# Altium footprint library PcbLib1.PcbLib: 150 footprints (part 9 of 10)
Each footprint in its own frame and in the unit in brackets; x right, y up, seen from the top. Pads: shape width x height; smd on the part's side, far side on the other; paste and mask are expansions set on the pad; w line width, h text height; cw(c..) or ccw(c..) is an arc to the next point about the centre after c.
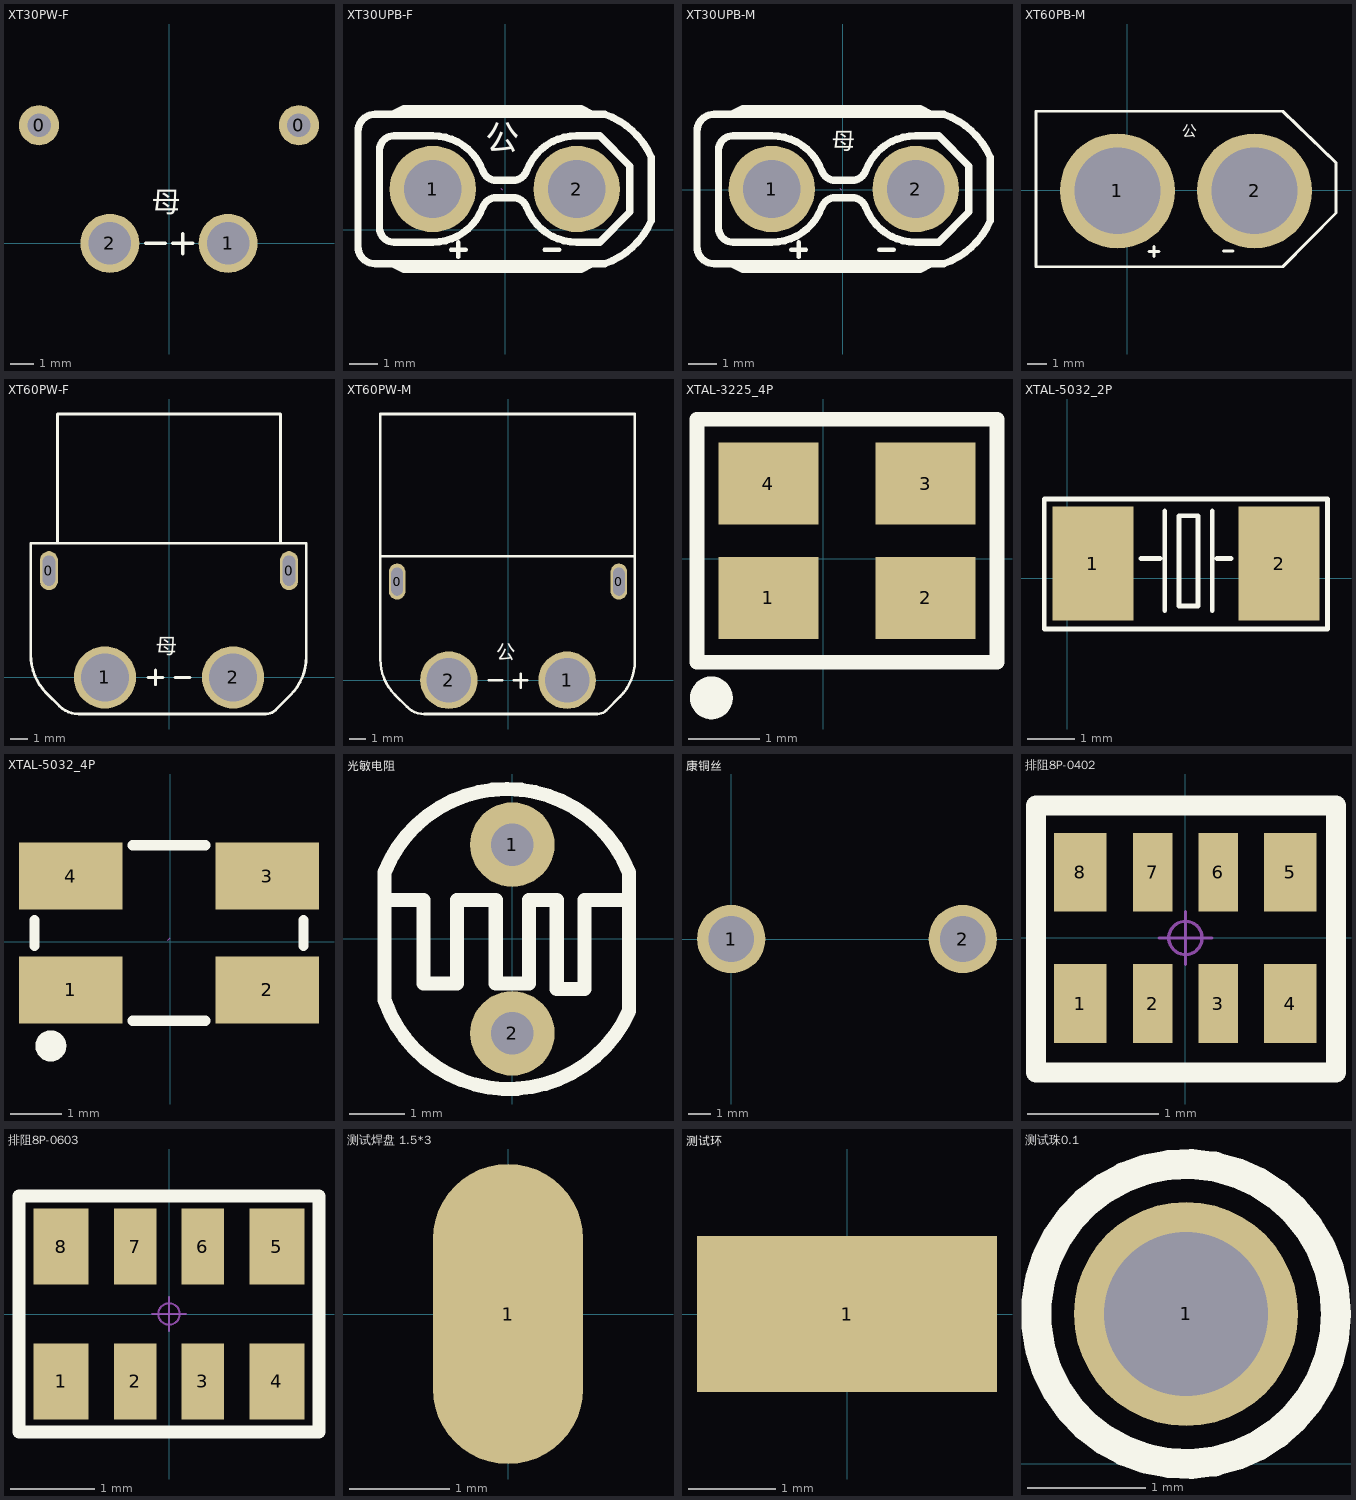
[diagram p8: the footprints below, top view; thin cyan lines are the x and y axes]

## XT30PW-F [mm]
pads (4):
  round 1.7 hole 1 unplated: 0(-5.5,5) 0(5.5,5)
  round 2.5 hole 1.8: 1(2.5,0) 2(-2.5,0)
Top Overlay:
  lines w0.152: -0.991,0 -0.152,0 ; 0.165,0 1.003,0 ; 0.584,-0.445 0.584,0.394
  text "母" at -0.737,1.016 h1.52
3D body "User Library-XT30PW-F.STEP": height 5, standoff -2, extent -6.701,-0.959 6.599,13.941

## XT30UPB-F [mm]
pads (2):
  round 3 hole 2: 1(-2.511,1.422) 2(2.489,1.422)
Top Overlay:
  lines w0.152: -1.88,-0.686 -1.372,-0.686 ; -1.626,-0.94 -1.626,-0.432 ; 1.372,-0.686 1.88,-0.686
  lines w0.254: -3.911,-1.177 -3.511,-1.377 2.639,-1.377 3.039,-1.177 ; -3.911,4.023 -3.511,4.223 2.639,4.223 3.039,4.023 ; -5.111,-0.577 ccw(c-4.511,-0.577) -4.511,-1.177 3.464,-1.177 ccw(c2.568,1.423) 5.089,0.323 5.089,2.523 ccw(c2.568,1.423) 3.464,4.023 -4.511,4.023 ccw(c-4.511,3.423) -5.111,3.423 -5.111,-0.577 ; -4.361,0.073 ccw(c-3.861,0.073) -3.861,-0.427 -2.511,-0.427 ccw(c-2.511,1.423) -0.772,0.793 cw(c-0.302,0.623) -0.302,1.123 0.279,1.123 cw(c0.279,0.623) 0.749,0.793 ccw(c2.489,1.423) 2.489,-0.427 3.289,-0.427 4.339,0.623 4.339,2.223 3.289,3.273 2.489,3.273 ccw(c2.489,1.423) 0.749,2.052 cw(c0.279,2.223) 0.279,1.723 -0.302,1.723 cw(c-0.302,2.223) -0.772,2.052 ccw(c-2.511,1.423) -2.511,3.273 -3.861,3.273 ccw(c-3.861,2.773) -4.361,2.773 -4.361,0.073
  text "公" at -0.711,2.515 h1.52
Mechanical 15:
  lines w0.003: -0.15,1.448 -0.099,1.397
3D body "User Library-XT30UPB-F-1.STEP": height 9.6, standoff -1.8, extent -5.049,-1.143 5.151,4.057

## XT30UPB-M [mm]
pads (2):
  round 3 hole 2: 1(-2.46,0.025) 2(2.54,0.025)
Top Overlay:
  lines w0.152: -1.778,-2.083 -1.27,-2.083 ; -1.524,-2.337 -1.524,-1.829 ; 1.27,-2.083 1.778,-2.083
  lines w0.254: -3.86,-2.574 -3.46,-2.774 2.69,-2.774 3.09,-2.574 ; -3.86,2.626 -3.46,2.826 2.69,2.826 3.09,2.626 ; -5.06,-1.974 ccw(c-4.46,-1.974) -4.46,-2.574 3.515,-2.574 ccw(c2.619,0.026) 5.14,-1.074 5.14,1.126 ccw(c2.619,0.026) 3.515,2.626 -4.46,2.626 ccw(c-4.46,2.026) -5.06,2.026 -5.06,-1.974 ; -4.31,-1.324 ccw(c-3.81,-1.324) -3.81,-1.824 -2.46,-1.824 ccw(c-2.46,0.026) -0.721,-0.604 cw(c-0.251,-0.774) -0.251,-0.274 0.33,-0.274 cw(c0.33,-0.774) 0.8,-0.604 ccw(c2.54,0.026) 2.54,-1.824 3.34,-1.824 4.39,-0.774 4.39,0.826 3.34,1.876 2.54,1.876 ccw(c2.54,0.026) 0.8,0.655 cw(c0.33,0.826) 0.33,0.326 -0.251,0.326 cw(c-0.251,0.826) -0.721,0.655 ccw(c-2.46,0.026) -2.46,1.876 -3.81,1.876 ccw(c-3.81,1.376) -4.31,1.376 -4.31,-1.324
  text "母" at -0.381,1.194 h1.02
Mechanical 15:
  lines w0.003: -0.099,0.051 -0.048,0
3D body "User Library-XT30.STEP": height 12.6, standoff -2.9, extent -5.149,-2.684 5.251,2.616

## XT60PB-M [mm]
pads (2):
  round 6 hole 4.5: 1(-0.508,-0.025) 2(6.629,-0.025)
Top Overlay:
  lines w0.152: 1.143,-3.175 1.651,-3.175 ; 1.397,-3.429 1.397,-2.921 ; 5.004,-3.15 5.512,-3.15 ; -4.75,-3.974 -4.75,4.126 8.103,4.126 10.871,1.448 10.871,-1.168 8.103,-3.974 -4.75,-3.974
  text "公" at 2.845,2.616 h1.02
3D body "XT60UPB Fem Vert.STEP": height 13.54, standoff -2.06, extent -4.653,-4.001 10.69,3.9

## XT60PW-F [mm]
pads (4):
  oval 1x2.2 hole 0.7 slot 1.7 at 90 deg: 0(-6.75,6) 0(6.75,6)
  round 3.5 hole 2.7: 1(-3.6,0) 2(3.6,0)
Top Overlay:
  lines w0.152: -6.274,7.544 -6.274,14.808 6.274,14.808 6.274,7.645 ; -1.181,0 -0.343,0 ; -0.762,-0.419 -0.762,0.419 ; 0.343,0 1.181,0 ; -7.772,1.27 ccw(c-4.706,1.27) -6.874,-0.898 -6.158,-1.615 ccw(c-5.089,-0.545) -5.089,-2.057 -4.902,-2.057 5.258,-2.057 5.443,-2.057 ccw(c5.443,-1.277) 5.994,-1.829 6.824,-1 ccw(c4.656,1.168) 7.722,1.168 7.722,1.905 7.722,7.544 -7.772,7.544 -7.772,2.007 -7.772,1.27
  text "母" at -0.737,1.016 h1.52
3D body "XT60PW_F.STEP": height 8.93, standoff -1.57, extent -7.95,-1.944 7.95,15.356

## XT60PW-M [mm]
pads (4):
  oval 1x2.2 hole 0.7 slot 1.7 at 90 deg: 0(-6.75,6) 0(6.75,6)
  round 3.5 hole 2.7: 1(3.6,0) 2(-3.6,0)
Top Overlay:
  lines w0.152: -1.181,0 -0.343,0 ; 0.343,0 1.181,0 ; 0.762,-0.445 0.762,0.394 ; 7.722,7.468 7.722,16.205 -7.772,16.205 -7.772,7.544 ; -7.772,7.544 -7.772,2.007 -7.772,1.27 ccw(c-4.706,1.27) -6.874,-0.898 -6.158,-1.615 ccw(c-5.089,-0.545) -5.089,-2.057 -4.902,-2.057 5.258,-2.057 5.443,-2.057 ccw(c5.443,-1.277) 5.994,-1.829 6.824,-1 ccw(c4.656,1.168) 7.722,1.168 7.722,1.905 7.722,7.544 -7.772,7.544
  text "公" at -0.737,1.016 h1.52
3D body "XT60PW 3D DRAWING.STEP": height 9.18, standoff -1.32, extent -7.924,-1.936 7.976,16.364

## XTAL-3225_4P [mm]
pads (5):
  round 0 smd: 1(-0.77,-0.55)
  rect 1.4x1.15 smd: 1(-0.77,-0.55) 2(1.43,-0.55) 3(1.43,1.051) 4(-0.77,1.051)
Top Overlay:
  lines w0.203: -1.77,-1.45 2.43,-1.45 2.43,1.95 -1.77,1.95 -1.77,-1.45
  lines w0.3: -1.57,-1.799 ccw(c-1.569,-1.949) -1.567,-1.799
3D body "User Library-SG310.STEP": height 1.05, standoff 0, extent -1.244,-1.021 1.956,1.479

## XTAL-5032_2P [mm]
pads (2):
  rect 1.7x2.4 smd: 1(0.545,0.312) 2(4.466,0.311)
Top Overlay:
  lines w0.1: 1.559,0.421 1.959,0.421 ; 2.059,-0.679 2.059,1.421 ; 3.059,-0.679 3.059,1.421 ; 3.159,0.421 3.459,0.421 ; 2.359,-0.579 2.759,-0.579 2.759,1.321 2.359,1.321 2.359,-0.579
  lines w0.102: -0.483,-1.067 -0.483,1.676 5.486,1.676 5.486,-1.067 -0.483,-1.067

## XTAL-5032_4P [mm]
pads (4):
  rect 2x1.3 smd: 1(-1.921,-0.927) 2(1.879,-0.927) 3(1.879,1.273) 4(-1.921,1.273)
Top Overlay:
  lines w0.2: -2.622,-0.076 -2.622,0.422 ; -0.722,-1.526 0.68,-1.526 ; -0.722,1.872 0.68,1.872 ; 2.58,-0.076 2.58,0.422
  lines w0.3: -2.307,-1.859 ccw(c-2.306,-2.009) -2.304,-1.859
Mechanical 15:
  lines w0.003: -0.046,0.029 0.004,0.08
3D body "User Library-CRYSTALSMD5X32.STEP": height 1, standoff 0, extent -2.525,-1.447 2.475,1.753

## 光敏电阻 [mil]
pads (2):
  round 60 hole 30: 1(0,66.93) 2(0,-66.93)
Top Overlay:
  lines w10: -90.6,-43.27 ccw(c-2.4,-13.19) 82.7,-51.17 ; -90.6,47.23 cw(c-3.95,13.33) 82.7,47.23 82.68,-51.18 ; -90.55,-43.31 -90.55,47.24 ; -90.55,27.56 -62.99,27.56 -62.99,-31.5 -39.37,-31.5 -39.37,27.56 -11.81,27.56 -11.81,-31.5 11.81,-31.5 11.81,27.56 31.5,27.56 31.5,-35.43 51.18,-35.43 51.18,27.56 82.68,27.56

## 康铜丝 [mm]
pads (2):
  round 3 hole 2: 1(0,0) 2(10.16,0)

## 排阻8P-0402 [mm] "2mm*1mm*0.45mm(长*宽*厚)"
pads (8):
  rect 0.4x0.6 smd: 1(-0.8,-0.5) 4(0.8,-0.5) 5(0.8,0.5) 8(-0.8,0.5)
  rect 0.3x0.6 smd: 2(-0.25,-0.5) 3(0.25,-0.5) 6(0.25,0.5) 7(-0.25,0.5)
Top Overlay:
  lines w0.152: -1.139,-1.024 1.147,-1.024 1.147,1.008 -1.139,1.008 -1.139,-1.024
Mechanical 15:
  circle w0.025: c0,0 r0.127
  lines w0.025: -0.2,0 0.2,0 ; 0,-0.2 0,0.2
3D body "RCA-8P4R-0402.STEP": height 0.45, standoff 0, extent -1,-0.5 1,0.5

## 排阻8P-0603 [mm] "3.2mm*1.6mm*0.6mm(长*宽*厚)"
pads (8):
  rect 0.65x0.9 smd: 1(-1.28,-0.8) 4(1.28,-0.8) 5(1.28,0.8) 8(-1.28,0.8)
  rect 0.5x0.9 smd: 2(-0.4,-0.8) 3(0.4,-0.8) 6(0.4,0.8) 7(-0.4,0.8)
Top Overlay:
  lines w0.152: -1.778,-1.397 -1.778,1.397 1.778,1.397 1.778,-1.397 -1.778,-1.397
Mechanical 15:
  circle w0.025: c0,0 r0.127
  lines w0.025: -0.2,0 0.2,0 ; 0,-0.2 0,0.2
3D body "RCA-8P4R-0603.STEP": height 0.6, standoff 0, extent -1.6,-0.8 1.6,0.8

## 测试焊盘 1.5*3 [mm]
pads (1):
  oval 1.5x3 smd: 1(0,0)

## 测试环 [mm]
pads (1):
  rect 3.43x1.78 smd: 1(0,0)
Mechanical 15:
  lines w0.003: -0.088,0.172 -0.038,0.223
3D body "测试点.STEP": height 1.52, standoff 0, extent -1.233,-0.508 1.233,0.512

## 测试珠0.1 [mm]
pads (1):
  round 1.9 hole 1.39: 1(1.702,1.27)
Top Overlay:
  circle w0.254: c1.702,1.27 r1.27
3D body "°2?D????òaμ?·a×°.STEP": height 4.62, standoff -3, extent 0.432,0 2.972,2.54